# Altium footprint library Custom_Library.PcbLib: 221 footprints (part 13 of 14)
Each footprint in its own frame and in the unit in brackets; x right, y up, seen from the top. Pads: shape width x height; smd on the part's side, far side on the other; paste and mask are expansions set on the pad; w line width, h text height; cw(c..) or ccw(c..) is an arc to the next point about the centre after c.
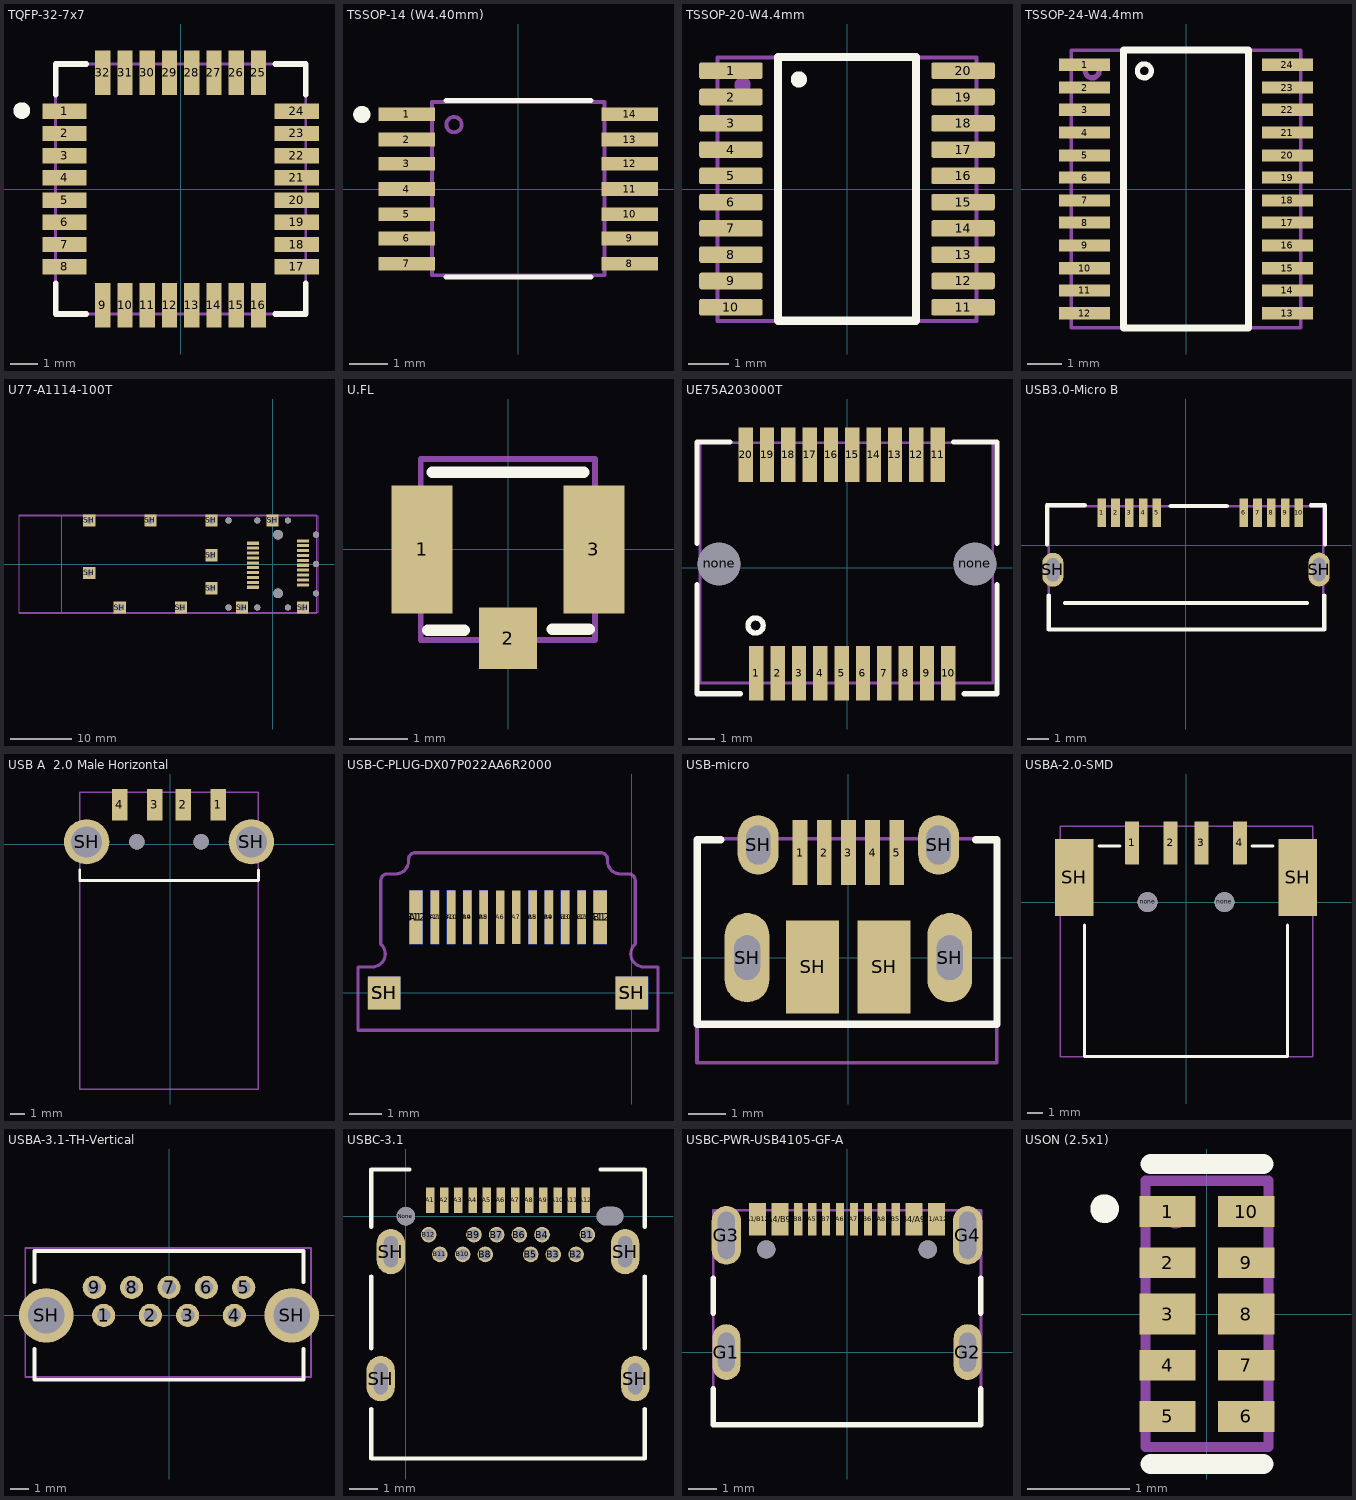
[diagram p12: the footprints below, top view; thin cyan lines are the x and y axes]

## TQFP-32-7x7 [mm]
pads (32):
  rect 1.6x0.55 smd: 1(-4.18,2.8) 2(-4.18,2) 3(-4.18,1.2) 4(-4.18,0.4) 5(-4.18,-0.4) 6(-4.18,-1.2) 7(-4.18,-2) 8(-4.18,-2.8) 17(4.18,-2.8) 18(4.18,-2) 19(4.18,-1.2) 20(4.18,-0.4) 21(4.18,0.4) 22(4.18,1.2) 23(4.18,2) 24(4.18,2.8)
  rect 0.55x1.6 smd: 9(-2.8,-4.18) 10(-2,-4.18) 11(-1.2,-4.18) 12(-0.4,-4.18) 13(0.4,-4.18) 14(1.2,-4.18) 15(2,-4.18) 16(2.8,-4.18) 25(2.8,4.18) 26(2,4.18) 27(1.2,4.18) 28(0.4,4.18) 29(-0.4,4.18) 30(-1.2,4.18) 31(-2,4.18) 32(-2.8,4.18)
Top Overlay:
  circle w0.4: c-5.718,2.822 r0.1
  lines w0.2: -4.5,-3.4 -4.5,-4.5 -3.4,-4.5 ; -4.5,3.4 -4.5,4.5 -3.4,4.5 ; 3.4,-4.5 4.5,-4.5 4.5,-3.4 ; 3.4,4.5 4.5,4.5 4.5,3.4
Top Assembly:
  lines w0.1: -4.5,-4.5 -4.5,4.5 -3.2,4.5 4.5,4.5 4.5,-4.5 -4.5,-4.5
  text "'.Designator'" at -3.3,-0.3 h1.27
3D body "ATMEGA328P-AUR--3DModel-STEP-56544.STEP": height 1.2, standoff 0, extent -4.5,-4.5 4.5,4.5

## TSSOP-14 (W4.40mm) [mil] "D8-M"
pads (14):
  rect 58x14 smd: 1(-115,77) 2(-115,51) 3(-115,26) 4(-115,0) 5(-115,-26) 6(-115,-51) 7(-115,-77) 8(115,-77) 9(115,-51) 10(115,-26) 11(115,0) 12(115,26) 13(115,51) 14(115,77)
Top Overlay:
  circle w9.84: c-161.25,76.79 r3.94
  lines w5: -74.8,-90.55 75.2,-90.55 ; -74.8,91.34 75.2,91.34
Top Assembly:
  circle w3.94: c-66.21,66.33 r7.87
  lines w3.94: -89,-88.98 89,-88.98 89,89.76 20.66,89.76 -22.24,89.76 -89,89.76 -89,-88.98 ; 89,71 89,83 89,71
  text "'.Designator'" at -198.96,-155.87 h78.74
3D body "MCP4442-TSSOP14.STEP": height 43.67, standoff 0.39, extent -126.75,-87.56 126.41,87.63

## TSSOP-20-W4.4mm [mm]
pads (20):
  rrect25% 1.57x0.41 smd: 1(-2.87,2.925) 2(-2.87,2.275) 3(-2.87,1.625) 4(-2.87,0.975) 5(-2.87,0.325) 6(-2.87,-0.325) 7(-2.87,-0.975) 8(-2.87,-1.625) 9(-2.87,-2.275) 10(-2.87,-2.925) 11(2.87,-2.925) 12(2.87,-2.275) 13(2.87,-1.625) 14(2.87,-0.975) 15(2.87,-0.325) 16(2.87,0.325) 17(2.87,0.975) 18(2.87,1.625) 19(2.87,2.275) 20(2.87,2.925)
Top Overlay:
  circle w0.2: c-1.191,2.71 r0.1
  lines w0.2: -1.707,-3.258 -1.707,3.266 -0.802,3.266 1.705,3.266 1.705,-3.258 -1.707,-3.258
Top Assembly:
  circle w0.2: c-2.581,2.577 r0.1
  lines w0.1: -3.204,-3.26 3.203,-3.26 3.203,3.255 -0.262,3.255 -3.204,3.255 -3.204,-3.26
  text "'.Designator'" at -5.052,-5.418 h2
3D body "TXS0108EPWR.STEP": height 1.2, standoff 0, extent -3.2,-3.25 3.2,3.25

## TSSOP-24-W4.4mm [mil]
pads (24):
  rect 58x14 smd: 1(-115,141) 2(-115,115) 3(-115,90) 4(-115,64) 5(-115,38) 6(-115,13) 7(-115,-13) 8(-115,-38) 9(-115,-64) 10(-115,-90) 11(-115,-115) 12(-115,-141) 13(115,-141) 14(115,-115) 15(115,-90) 16(115,-64) 17(115,-38) 18(115,-13) 19(115,13) 20(115,38) 21(115,64) 22(115,90) 23(115,115) 24(115,141)
Top Overlay:
  circle w5.91: c-47.24,133.86 r7.87
  lines w7.87: -70.87,-157.48 70.87,-157.48 70.87,157.48 -35.43,157.48 -70.87,157.48 -70.87,-157.48
Top Assembly:
  circle w5.91: c-106.3,133.86 r7.87
  lines w3.94: -129.92,-157.48 -129.92,157.48 -90.55,157.48 129.92,157.48 129.92,-157.48 -129.92,-157.48
  text "'.Designator'" at -193.29,-225.52 h78.74
3D body "User Library-TSSOP24_(JEDEC_MO-153).STEP": height 47.24, standoff 0, extent -129.05,-155.51 129.05,155.51

## U77-A1114-100T [mm]
pads (42):
  rect 2x0.5 smd: 1(-3.2,3.395) 2(-3.2,2.595) 3(-3.2,1.795) 4(-3.2,0.995) 5(-3.2,0.195) 6(-3.2,-0.605) 7(-3.2,-1.405) 8(-3.2,-2.205) 9(-3.2,-3.005) 10(-3.2,-3.805) 11(5,-3.405) 12(5,-2.605) 13(5,-1.805) 14(5,-1.005) 15(5,-0.205) 16(5,0.595) 17(5,1.395) 18(5,2.195) 19(5,2.995) 20(5,3.795)
  round 1 hole 1 unplated: none(-7.2,-7.125) none(-7.2,7.125) none(-2.5,-7.125) none(-2.5,7.125) none(2.5,-7.125) none(2.5,7.125) none(7.1,-4.805) none(7.1,-0.005) none(7.1,4.795)
  round 1.6 hole 1.6 unplated: none(0.9,-4.805) none(0.9,4.795)
  rect 2x2 / inner round 1.848 / far side rect 2x2 hole 1.1: SH(-30,-1.455) SH(-30,7.125) SH(-25,-7.125) SH(-20,7.125) SH(-15,-7.125) SH(-10,-3.955) SH(-10,1.445) SH(-10,7.125) SH(-5,-7.125) SH(0,7.125) SH(5,-7.125)
Top Assembly:
  lines w0.1: -41.5,-8.1 -41.5,8.1 -34.7,8.1 7.2,8.1 7.2,-8.1 -41.5,-8.1
  lines w0.127: -34.5,-7.9 -34.5,7.9
  text "'.Designator'" at -25.407,-0.124 h2
Board:
  lines w0.2: -41.5,-7.925 -41.5,7.925 7.48,7.925 7.48,-7.925 -41.5,-7.925
3D body "10099100011lf.stp": height 2.7, standoff -11, extent -41.498,-8.091 7.222,8.106
3D body "M-UE75-A20-X000T-REVG4.STEP": height 5.25, standoff -1.08, extent -3.644,-5.514 5.297,5.486

## U.FL [mm]
pads (3):
  rect 1.05x2.2 smd: 1(-1.475,0) 3(1.475,0)
  rect 1x1.05 smd: 2(0,-1.525)
Top Overlay:
  lines w0.2: -1.38,-1.387 -0.75,-1.387 ; -1.3,1.325 1.3,1.325 ; 0.76,-1.369 1.39,-1.369
Top Assembly:
  lines w0.1: -1.498,-1.552 1.495,-1.552 1.495,1.55 -1.498,1.55 -1.498,-1.552
  text "'.Designator'" at -4.717,-3.654 h2
3D body "U.FL-R-SMT-1(10)--3DModel-STEP-56544.STEP": height 1.25, standoff 0, extent -1.5,-1.55 1.5,1.55

## UE75A203000T [mil]
pads (22):
  rect 21x81 smd paste+0 mask+3: 1(-133.86,-155.61) 2(-102.36,-155.61) 3(-70.87,-155.61) 4(-39.37,-155.61) 5(-7.87,-155.61) 6(23.62,-155.61) 7(55.12,-155.61) 8(86.61,-155.61) 9(118.11,-155.61) 10(149.61,-155.61) 11(133.86,167.22) 12(102.36,167.22) 13(70.87,167.22) 14(39.37,167.22) 15(7.87,167.22) 16(-23.62,167.22) 17(-55.12,167.22) 18(-86.61,167.22) 19(-118.11,167.22) 20(-149.61,167.22)
  round 63 hole 63: none(-188.98,5.8) none(188.98,5.8)
Top Overlay:
  circle w7.87: c-135,-85 r11.18
  lines w7.87: -221.5,-24.72 -221.5,-186 -157.46,-186 ; -221.5,36.32 -221.5,186 -173.21,186 ; 157.46,186 221.5,186 221.5,36.32 ; 173.21,-186 221.5,-186 221.5,-24.72
Top Assembly:
  lines w3.94: -217.15,-170 -217.15,185 -170,185 215,185 215,-170 -217.15,-170
  text "'.Designator'" at -208.25,49.9 h78.74
3D body: height 10, standoff 0, extent 0,0 10,10
3D body "M-UE75-A20-X000T-REVG4.STEP": height 206.73, standoff -42.52, extent -216.38,-169.57 216.69,182.43

## USB3.0-Micro B [mil]
pads (12):
  rect 16x53 smd: 1(-156.5,60.57) 2(-130.91,60.57) 3(-105.31,60.57) 4(-79.72,60.57) 5(-54.13,60.57) 6(107.28,60.57) 7(132.87,60.57) 8(158.46,60.57) 9(184.06,60.57) 10(209.65,60.57)
  oval 39.37x62.99 hole 43.31 slot 23.62 at 0 deg unplated: SH(-247.05,-45.23) SH(247.05,-44.82)
Top Overlay:
  lines w7.87: -258,1.99 -258,74.7 -187.99,74.7 ; -254.92,-92.97 -254.92,-155.96 -195.87,-155.96 256.89,-155.96 256.89,-92.97 ; -224.74,-106.93 224.74,-106.93 ; -28.37,73.22 75.79,73.22 ; 232.25,74.7 258,74.7 258,1.99
Top Assembly:
  lines w3.94: -254.92,-155.96 204.11,-155.96 254.8,-155.96 254.8,-86.18 254.8,72.69 88.73,72.69 -254.92,72.69 -254.92,-6.36 -254.92,-155.96
  text "'.Designator'" at -196.41,-234.38 h78.74
3D body "aaaa.STEP": height 107.47, standoff -38.98, extent -254.62,-155.91 254.76,73.15
3D body: height 10, standoff 0, extent -156.5,60.57 -146.5,70.57

## USB A  2.0 Male Horizontal [mm]
pads (8):
  rrect4% 1.1x2.25 smd: 1(3.4,2.8) 2(0.9,2.8) 3(-1.1,2.8) 4(-3.6,2.8)
  round 3.216 hole 2.2: SH(-5.95,0.175) SH(5.75,0.175)
  round 1.1 hole 1.1 unplated: ""(-2.375,0.175) ""(2.175,0.175)
Top Overlay:
  lines w0.2: -6.447,-1.825 -6.447,-2.575 6.256,-2.575 6.256,-1.825
Top Assembly:
  lines w0.1: -6.444,-17.391 6.244,-17.391 6.244,3.7 -6.444,3.7 -6.444,-17.391
  text "'.Designator'" at -5.463,-5.04 h2
3D body "USB-AM-S-F-B-SM1.stp": height 3.15, standoff -2.74, extent -6.441,-17.424 6.259,3.726

## USB-C-PLUG-DX07P022AA6R2000 [mm]
pads (26):
  rect 0.41x1.65 smd mask+0.05: A1(-6.62,2.324) A12(-0.975,2.323)
  rect 0.26x1.65 smd mask+0.05: A2(-6.045,2.324) A3(-5.545,2.324) A4(-5.045,2.324) A5(-4.545,2.324) A6(-4.045,2.324) A7(-3.545,2.324) A8(-3.045,2.324) A9(-2.545,2.324) A10(-2.045,2.324) A11(-1.545,2.324)
  rect 0.41x1.65 smd far side mask+0.05: B1(-0.975,2.323) B12(-6.62,2.324)
  rect 0.26x1.65 smd far side mask+0.05: B2(-1.545,2.324) B3(-2.045,2.324) B4(-2.545,2.324) B5(-3.045,2.324) B8(-4.545,2.324) B9(-5.045,2.324) B10(-5.545,2.324) B11(-6.045,2.324)
  rect 1x1 smd mask+0.05: SH(-7.6,0) SH(0,0)
  rect 1x1 smd far side mask+0.05: SH(-7.6,0) SH(0,0)
Top Assembly:
  lines w0.1: -8.4,-1.139 0.8,-1.139 0.8,0.8 0.365,0.8 cw(c0.365,1.2) 0.1,1.5 0.1,3.45 ccw(c-0.1,3.45) -0.1,3.65 -0.35,3.65 cw(c-0.35,4.05) -0.75,4.05 -0.75,4.1 ccw(c-0.95,4.1) -0.95,4.3 -6.65,4.3 ccw(c-6.65,4.1) -6.85,4.1 -6.85,4.05 cw(c-7.25,4.05) -7.25,3.65 -7.5,3.65 ccw(c-7.5,3.45) -7.7,3.45 -7.7,1.5 cw(c-7.965,1.2) -7.965,0.8 -8.4,0.8 -8.4,-1.139
3D body "dx07p022aa6r2000.stp": height 1.2, standoff -2, extent -7.926,-0.125 0.324,12.875

## USB-micro [mm]
pads (11):
  rect 0.4x1.75 smd: 1(-1.3,2.825) 2(-0.65,2.825) 3(0,2.825) 4(0.65,2.825) 5(1.3,2.825)
  oval 1.2x2.4 hole 0.7 slot 1.2 at 90 deg: SH(-2.725,0) SH(2.725,0)
  oval 1.1x1.6 hole 0.65 slot 1.05 at 90 deg: SH(-2.425,3.03) SH(2.425,3.03)
  rect 1.425x2.5 smd: SH(-0.962,-0.25) SH(0.962,-0.25)
Top Overlay:
  lines w0.2: -3.429,3.175 -4.064,3.175 -4.064,-1.789 -3.75,-1.789 1.906,-1.789 3.75,-1.789 3.996,-1.789 3.996,3.175 3.429,3.175
Top 3D Body:
  lines w0: -2.745,-0.6 -2.705,-0.6 ; -2.745,0.6 -2.705,0.6 ; 2.705,-0.6 2.745,-0.6 ; 2.705,0.6 2.745,0.6
Top Assembly:
  lines w0.1: -4.07,-2.826 3.987,-2.826 3.987,3.201 -3.203,3.201 -4.07,3.201 -4.07,-2.826
  text "'.Designator'" at -5.381,4.524 h2
3D body "step_temp.STEP": height 2.92, standoff -0.68, extent -4.035,-2.829 4.005,3.204

## USBA-2.0-SMD [mm]
pads (8):
  rrect4% 0.9x2.8 smd mask+0.155: 1(-3.5,3.85) 2(-1,3.85) 3(1,3.85) 4(3.5,3.85)
  round 1.3 hole 1.3 unplated: none(-2.5,0) none(2.5,0)
  rect 2.5x5 smd mask+0.2: SH(-7.25,1.6) SH(7.25,1.6)
Top Overlay:
  lines w0.2: -6.6,-1.5 -6.6,-10.05 6.6,-10.05 6.6,-1.5 ; -5.65,3.65 -4.3,3.65 ; 4.3,3.65 5.65,3.65
Top Assembly:
  lines w0.1: -8.164,-10.045 -8.164,4.938 -5.354,4.938 8.234,4.938 8.234,-10.045 -8.164,-10.045
  text "'.Designator'" at -5.363,-6.64 h2
3D body "USB-A-S-F-B-SM2.STEP": height 7.79, standoff -1.1, extent -8.2,-10.054 8.2,4.946

## USBA-3.1-TH-Vertical [mm]
pads (11):
  round 1.238 hole 0.73: 1(-3.5,0) 2(-1,0) 3(1,0) 4(3.5,0) 5(4,1.5) 6(2,1.5) 7(0,1.5) 8(-2,1.5) 9(-4,1.5)
  round 2.925 hole 1.95: SH(-6.57,0) SH(6.57,0)
Top Overlay:
  lines w0.2: -7.2,-1.78 -7.2,-3.45 7.2,-3.45 7.2,-1.78 ; -7.2,1.78 -7.2,3.45 7.2,3.45 7.2,1.78
Top Assembly:
  lines w0.1: -7.7,-3.3 7.6,-3.3 7.6,3.6 -7.7,3.6 -7.7,-3.3
  text "'.Designator'" at -5.399,-5.971 h2
3D body "USB1086-GF-B.stp": height 14.9, standoff -4, extent -7.65,-3.35 7.65,3.55

## USBC-3.1 [mm]
pads (30):
  rect 0.3x0.9 smd: A1(0.85,0.56) A2(1.35,0.56) A3(1.85,0.56) A4(2.35,0.56) A5(2.85,0.56) A6(3.35,0.56) A7(3.85,0.56) A8(4.35,0.56) A9(4.85,0.56) A10(5.35,0.56) A11(5.85,0.56) A12(6.35,0.56)
  round 0.55 hole 0.4 mask+0.07: B1(6.4,-0.65) B2(6,-1.35) B3(5.2,-1.35) B4(4.8,-0.65) B5(4.4,-1.35) B6(4,-0.65) B7(3.2,-0.65) B8(2.8,-1.35) B9(2.4,-0.65) B10(2,-1.35) B11(1.2,-1.35) B12(0.8,-0.65)
  round 0.65 hole 0.65 unplated: None(0,0)
  round 0.1 hole 0.65 slot 0.95 at 0 deg unplated mask+0.102: None(7.2,0)
  oval 1x1.6 hole 0.5 slot 1.1 at 90 deg: SH(-0.89,-5.73) SH(-0.53,-1.25) SH(7.73,-1.25) SH(8.09,-5.73)
Top Overlay:
  lines w0.15: -1.225,-6.8 -1.225,-8.55 8.425,-8.55 8.425,-6.8 ; -1.225,-4.66 -1.225,-2.13 ; -1.225,-0.37 -1.225,1.65 0.127,1.65 ; 6.858,1.65 8.425,1.65 8.425,-0.37 ; 8.425,-4.66 8.425,-2.13
Top Assembly:
  text "'.Designator'" at -2.299,-10.471 h2
3D body "10137061c.stp": height 3.17, standoff -1.02, extent -1.225,-8.531 8.425,1.669

## USBC-PWR-USB4105-GF-A [mm]
pads (18):
  rect 0.6x1.15 smd: A1/B12(-3.2,4.755) A4/B9(-2.4,4.755) B1/A12(3.2,4.755) B4/A9(2.4,4.755)
  rect 0.3x1.15 smd: A5(-1.25,4.755) A6(-0.25,4.755) A7(0.25,4.755) A8(1.25,4.755) B5(1.75,4.755) B6(0.75,4.755) B7(-0.75,4.755) B8(-1.75,4.755)
  oval 1x2 hole 0.6 slot 1.4 at 90 deg: G1(-4.32,0) G2(4.32,0)
  oval 1.05x2.1 hole 0.6 slot 1.7 at 90 deg: G3(-4.32,4.18) G4(4.32,4.18)
  round 0.65 hole 0.65 unplated: ""(-2.89,3.68) ""(2.89,3.68)
Top Overlay:
  lines w0.2: -4.79,-1.32 -4.79,-2.6 4.79,-2.6 4.79,-1.32 ; -4.79,1.4 -4.79,2.65 ; 4.79,1.4 4.79,2.65
Top Assembly:
  lines w0.1: -4.79,-2.595 -4.79,5.078 3.658,5.078 4.792,5.078 4.792,-2.595 -4.79,-2.595
  text "'.Designator'" at -5.334,-4.383 h2
3D body "USB4105-GF-A.stp": height 3.26, standoff -0.9, extent -4.784,-2.618 4.796,5.09

## USON (2.5x1) [mm]
pads (10):
  rect 0.55x0.3 smd: 1(-0.385,1) 2(-0.385,0.5) 4(-0.385,-0.5) 5(-0.385,-1) 6(0.385,-1) 7(0.385,-0.5) 9(0.385,0.5) 10(0.385,1)
  rect 0.55x0.4 smd: 3(-0.385,0) 8(0.385,0)
Top Overlay:
  circle w0.14: c-0.999,1.028 r0.07
  lines w0.2: -0.55,-1.464 0.55,-1.464 ; -0.55,1.464 0.55,1.464
Top Assembly:
  circle w0.14: c-0.306,0.976 r0.07
  lines w0.1: -0.6,-1.297 -0.6,1.3 -0.5,1.3 0.6,1.3 0.6,-1.297 -0.5,-1.297 -0.6,-1.297
  text "'.Designator'" at -2.5,-2.9 h2
3D body "TPD4E05U06DQAR--3DModel-STEP-56544.STEP": height 0.55, standoff 0, extent -0.5,-1.25 0.5,1.25